# Altium footprint library 接口库PCB.PcbLib: 76 footprints (part 5 of 5)
Each footprint in its own frame and in the unit in brackets; x right, y up, seen from the top. Pads: shape width x height; smd on the part's side, far side on the other; paste and mask are expansions set on the pad; w line width, h text height; cw(c..) or ccw(c..) is an arc to the next point about the centre after c.
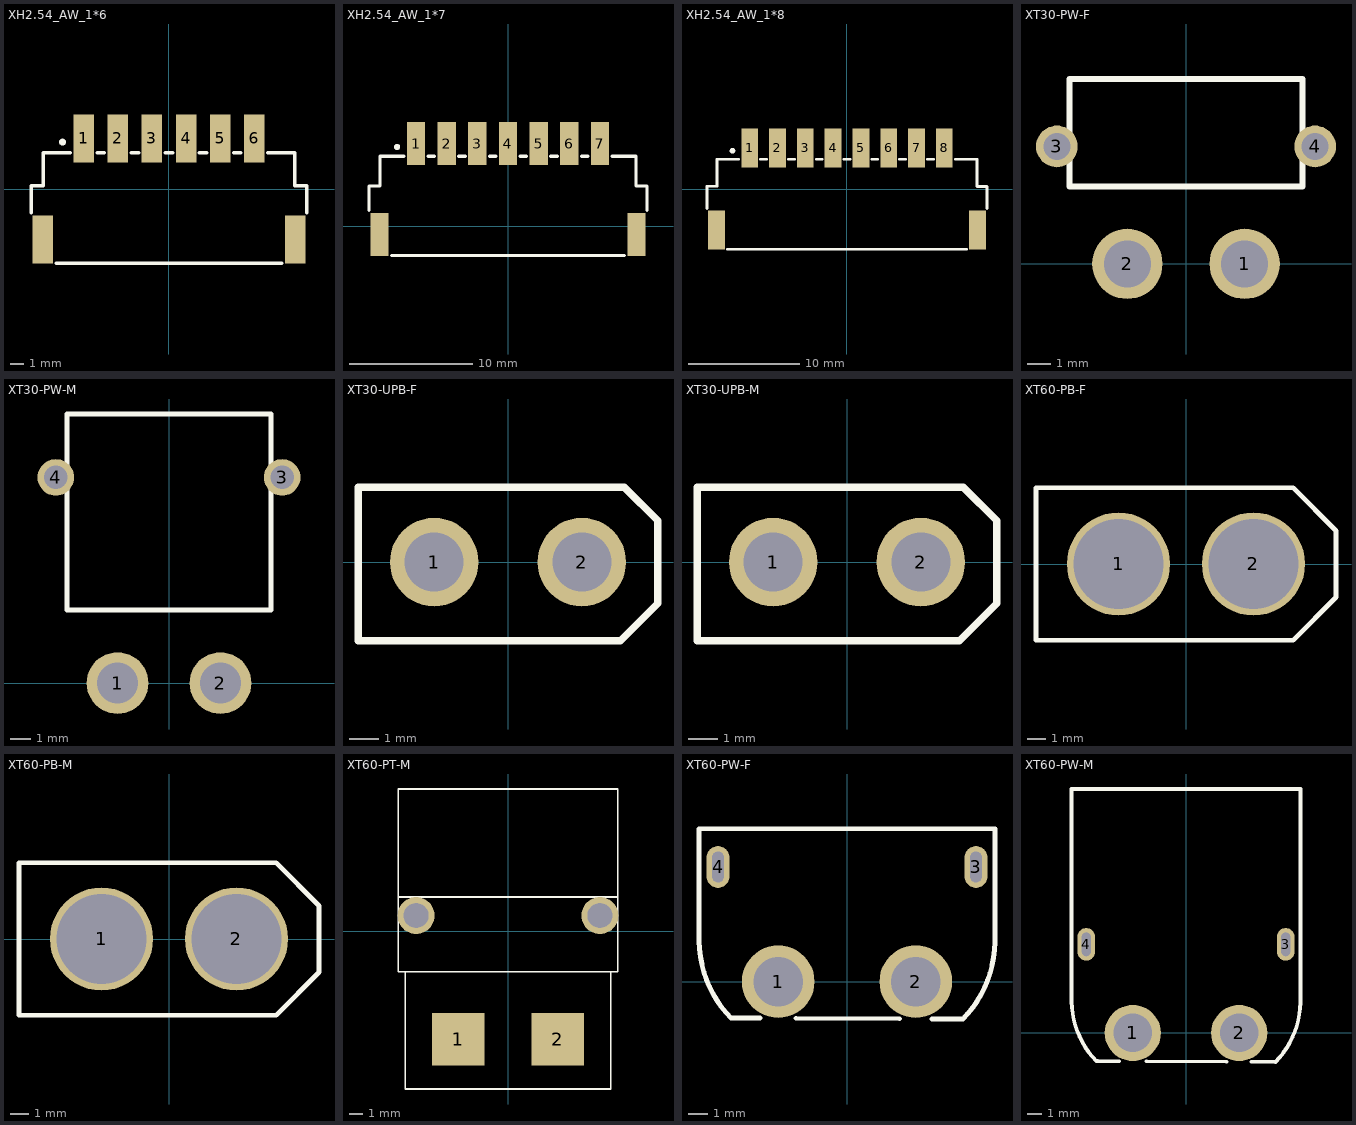
[diagram p4: the footprints below, top view; thin cyan lines are the x and y axes]

## XH2.54_AW_1*6 [mm]
pads (8):
  rect 1.5x3.5 smd: 1(-6.25,3.7) 2(-3.75,3.7) 3(-1.25,3.7) 4(1.25,3.7) 5(3.75,3.7) 6(6.25,3.7) ""(-9.23,-3.7) ""(9.23,-3.7)
Top Overlay:
  circle w0.254: c-7.794,3.429 r0.127
  lines w0.254: -10.08,-1.742 -10.08,0.254 -9.191,0.254 -9.191,0.857 -9.191,2.064 -9.191,2.667 -7.231,2.667 ; -8.249,-5.42 8.249,-5.42 ; -5.269,2.667 -4.731,2.667 ; -2.769,2.667 -2.231,2.667 ; -0.269,2.667 0.269,2.667 ; 2.231,2.667 2.769,2.667 ; 4.731,2.667 5.269,2.667 ; 7.231,2.667 9.191,2.667 9.191,0.234 10.08,0.234 10.08,-1.742
3D body "XH2.54_AW_6P.step": height 5.95, standoff -0.05, extent -9.705,-5.532 9.745,5.068

## XH2.54_AW_1*7 [mm]
pads (9):
  rect 1.5x3.5 smd: 1(-7.5,6.748) 2(-5,6.748) 3(-2.5,6.748) 4(0,6.748) 5(2.5,6.748) 6(5,6.748) 7(7.5,6.748) ""(-10.48,-0.652) ""(10.48,-0.652)
Top Overlay:
  circle w0.254: c-9.044,6.477 r0.127
  lines w0.254: -11.33,1.306 -11.33,3.302 -10.441,3.302 -10.441,3.905 -10.441,5.112 -10.441,5.715 -8.481,5.715 ; -9.499,-2.372 9.499,-2.372 ; -6.519,5.715 -5.981,5.715 ; -4.019,5.715 -3.481,5.715 ; -1.519,5.715 -0.981,5.715 ; 0.981,5.715 1.519,5.715 ; 3.481,5.715 4.019,5.715 ; 5.981,5.715 6.519,5.715 ; 8.481,5.715 10.441,5.715 10.441,3.282 11.33,3.282 11.33,1.306
3D body "XH2.54_AW_7P.stp": height 5.97, standoff -0.03, extent -10.975,-2.484 10.975,8.116

## XH2.54_AW_1*8 [mm]
pads (10):
  rect 1.5x3.5 smd: 1(-8.75,3.7) 2(-6.25,3.7) 3(-3.75,3.7) 4(-1.25,3.7) 5(1.25,3.7) 6(3.75,3.7) 7(6.25,3.7) 8(8.75,3.7) ""(-11.73,-3.7) ""(11.73,-3.7)
Top Overlay:
  circle w0.254: c-10.294,3.429 r0.127
  lines w0.254: -12.58,-1.742 -12.58,0.254 -11.691,0.254 -11.691,0.857 -11.691,2.064 -11.691,2.667 -9.731,2.667 ; -10.749,-5.42 10.749,-5.42 ; -7.769,2.667 -7.231,2.667 ; -5.269,2.667 -4.731,2.667 ; -2.769,2.667 -2.231,2.667 ; -0.269,2.667 0.269,2.667 ; 2.231,2.667 2.769,2.667 ; 4.731,2.667 5.269,2.667 ; 7.231,2.667 7.769,2.667 ; 9.731,2.667 11.691,2.667 11.691,0.234 12.58,0.234 12.58,-1.742
3D body "XH2.54_AW_8P.step": height 5.97, standoff -0.03, extent -12.258,-5.266 12.192,5.334

## XT30-PW-F [mm]
pads (4):
  round 3 hole 2: 1(2.5,0) 2(-2.5,0)
  round 1.778 hole 1.143: 3(-5.5,5) 4(5.5,5)
Top Overlay:
  lines w0.254: -4.953,3.293 -4.953,7.874 4.953,7.874 4.953,3.302 -4.953,3.302
3D body "User Library-XT30PW-F.step": height 5, standoff -2, extent -6.65,-1.057 6.65,13.843

## XT30-PW-M [mm]
pads (4):
  round 3 hole 2: 1(-2.5,0) 2(2.5,0)
  round 1.778 hole 1.143: 3(5.5,10) 4(-5.5,10)
Top Overlay:
  lines w0.254: -4.953,3.556 4.953,3.556 4.953,13.081 -4.953,13.081 -4.953,3.556
3D body "User Library-XT30PW-M.step": height 5, standoff -2, extent -6.65,-0.941 6.65,13.009

## XT30-UPB-F [mm]
pads (2):
  round 3 hole 2: 1(-2.5,0) 2(2.5,0)
Top Overlay:
  lines w0.254: -5.08,-2.667 -5.08,2.54 3.937,2.54 5.08,1.397 5.08,-1.397 3.81,-2.667 -5.08,-2.667
3D body "User Library-XT30UPB-F-1.STEP": height 9.4, standoff -2, extent -5.1,-2.6 5.1,2.6

## XT30-UPB-M [mm]
pads (2):
  round 3 hole 2: 1(-2.5,0) 2(2.5,0)
Top Overlay:
  lines w0.254: -5.08,-2.667 -5.08,2.54 3.937,2.54 5.08,1.397 5.08,-1.397 3.81,-2.667 -5.08,-2.667
3D body "User Library-xt30upb-m.STEP": height 9.4, standoff -2, extent -5.1,-2.649 5.1,2.551

## XT60-PB-F [mm]
pads (2):
  round 5.5 hole 4.8: 1(-3.6,0) 2(3.6,0)
Top Overlay:
  lines w0.254: -8.001,-4.064 -8.001,4.064 5.715,4.064 8.001,1.778 8.001,-1.778 5.715,-4.064 -8.001,-4.064
3D body "XT60-PB-M.step": height 14.92, standoff -1.5, extent -8.077,-4.332 7.823,4.318

## XT60-PB-M [mm]
pads (2):
  round 5.5 hole 4.8: 1(-3.6,0) 2(3.6,0)
Top Overlay:
  lines w0.254: -8.001,-4.064 -8.001,4.064 5.715,4.064 8.001,1.778 8.001,-1.778 5.715,-4.064 -8.001,-4.064
3D body "XT60-PB-F.step": height 16.6, standoff -1.5, extent -7.872,-4.05 8.128,4.05

## XT60-PT-M [mm]
pads (4):
  rect 3.81x3.81 smd: 1(-3.625,-7.875) 2(3.625,-7.875)
  round 2.7 hole 1.8 slot 1.8 at 0 deg: ""(-6.7,1.15) ""(6.7,1.15)
Top Overlay:
  lines w0.127: -8,2.5 -8,10.375 8,10.375 8,2.5 ; -8,2.5 -8,1.95 -8,0.3 -8,-2.95 -7.5,-2.95 ; -8,2.5 -7.45,2.5 -6,2.5 6,2.5 7.45,2.5 8,2.5 ; -7.5,-2.95 -7.5,-11.5 7.5,-11.5 7.5,-2.95 ; -7.5,-2.95 7.5,-2.95 ; 7.5,-2.95 8,-2.95 8,0.3 8,1.95 8,2.5
3D body "XT60PT-M Connector With Cover Assy.STEP": height 8.37, standoff -1.51, extent -8,-11.375 8,10.325

## XT60-PW-F [mm]
pads (4):
  round 3.8 hole 2.6: 1(-3.6,0) 2(3.6,0)
  oval 1.2x2.2 hole 0.6 slot 1.6 at 90 deg: 3(6.75,6) 4(-6.75,6)
Top Overlay:
  lines w0.254: -7.75,2 -7.75,8.001 -0.762,8.001 7.747,8.001 7.75,7.998 7.75,2 ; -7.747,2.111 ccw(c-1.749,2.254) -6.062,-1.917 ; -5.994,-1.902 -4.544,-1.909 ; -2.676,-1.919 2.738,-1.948 ; 4.441,-1.957 6.062,-1.965 ccw(c1.749,2.206) 7.747,2.063
3D body "XT60PW-F.step": height 9.1, standoff -1.35, extent -7.95,-1.908 7.95,15.392

## XT60-PW-M [mm]
pads (4):
  round 3.8 hole 2.6: 1(-3.6,0) 2(3.6,0)
  oval 1.2x2.2 hole 0.6 slot 1.6 at 90 deg: 3(6.75,6) 4(-6.75,6)
Top Overlay:
  lines w0.254: -7.75,2 -7.75,16.51 7.747,16.51 7.75,16.513 7.75,2 ; -7.747,2.111 ccw(c-1.749,2.254) -6.062,-1.917 ; -5.994,-1.902 -4.544,-1.909 ; -2.676,-1.919 2.738,-1.948 ; 4.441,-1.957 6.062,-1.965 ccw(c1.749,2.206) 7.747,2.063
3D body "XT60-PW-M.step": height 8.1, standoff -2.35, extent -7.95,-1.92 7.95,16.38